# Altium footprint library SMPS1.PcbLib: 25 footprints (part 1 of 2)
Each footprint in its own frame and in the unit in brackets; x right, y up, seen from the top. Pads: shape width x height; smd on the part's side, far side on the other; paste and mask are expansions set on the pad; w line width, h text height; cw(c..) or ccw(c..) is an arc to the next point about the centre after c.
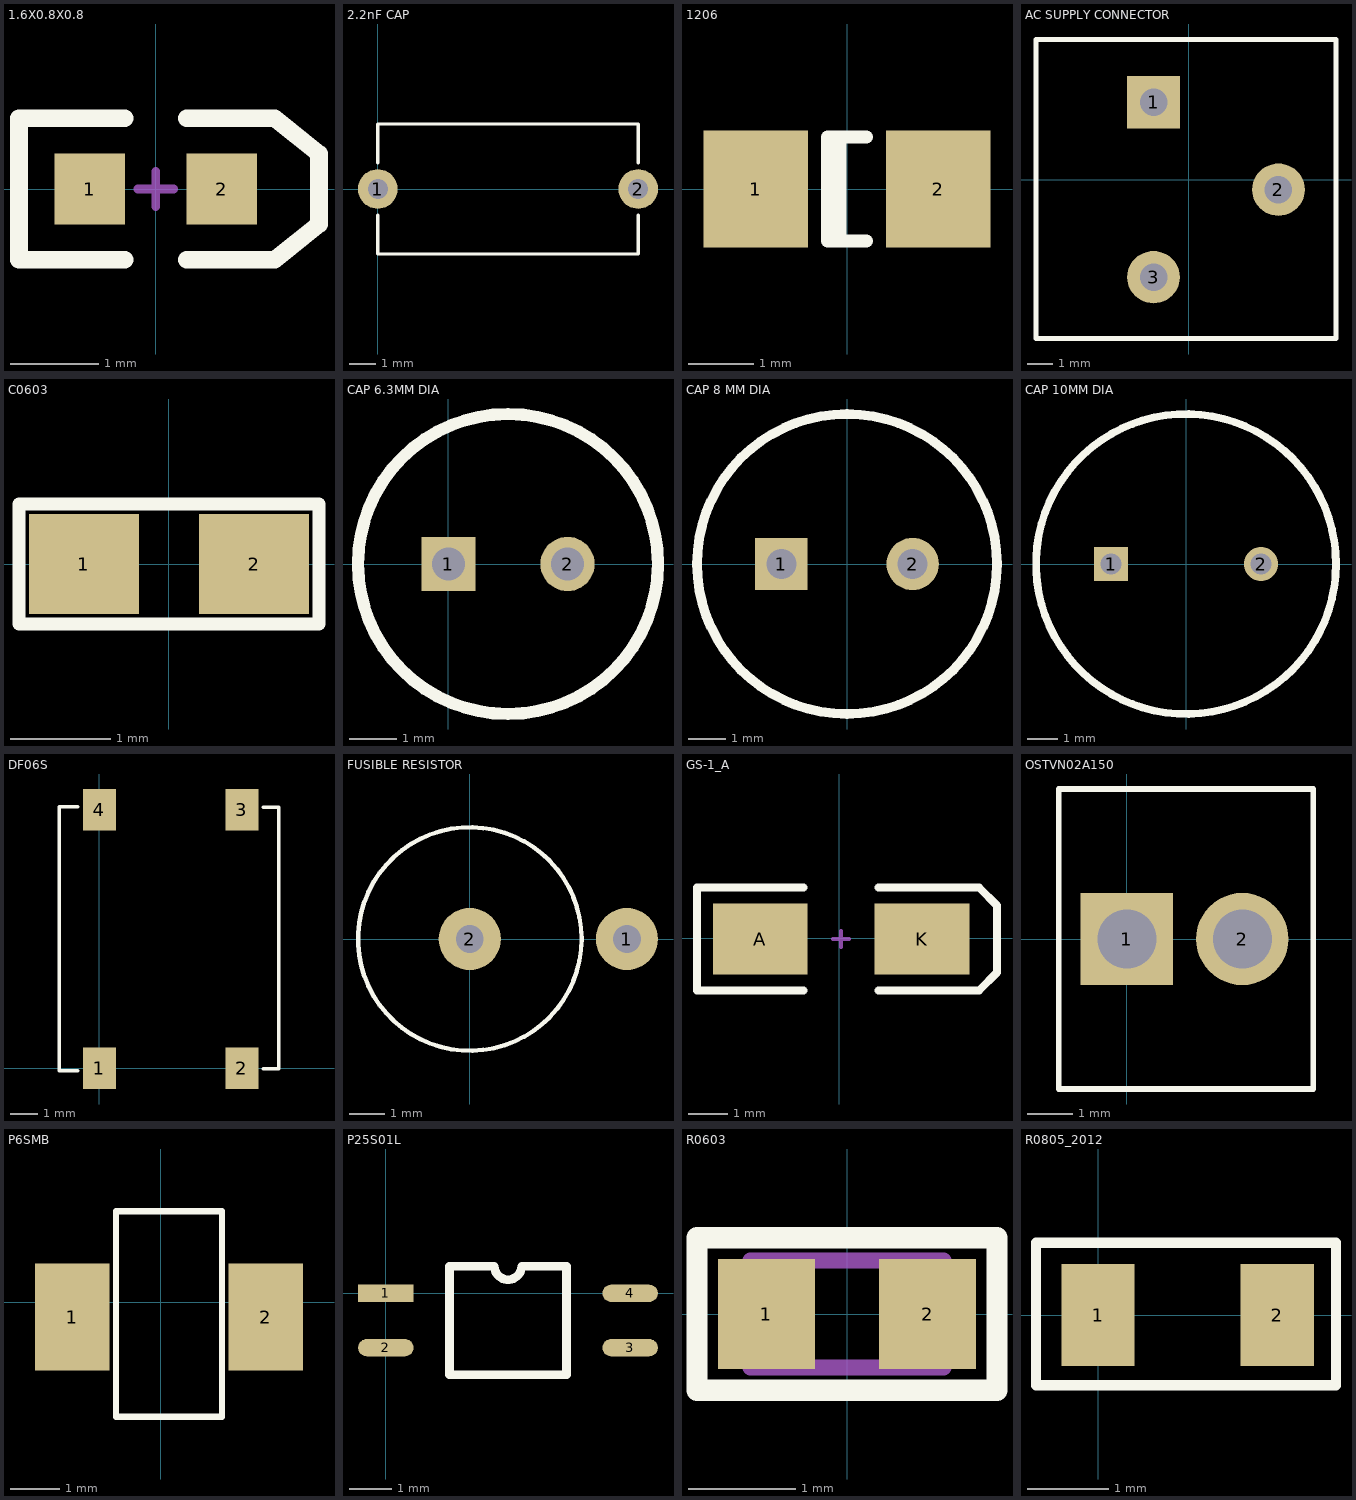
[diagram p0: the footprints below, top view; thin cyan lines are the x and y axes]

## 1.6X0.8X0.8 [mm] "SM LED; 2 Flat Leads"
height 0.9
pads (2):
  rect 0.8x0.8 smd: 1(-0.75,0) 2(0.75,0)
Top Overlay:
  lines w0.2: -0.35,-0.8 -1.55,-0.8 -1.55,0.8 -0.35,0.8 ; 0.35,-0.8 1.35,-0.8 1.85,-0.4 1.85,0.4 1.35,0.8 0.35,0.8
Mechanical 1:
  lines w0.1: -0.2,0 0.2,0 ; 0,-0.2 0,0.2
3D body: height 0.6, standoff 0, extent -0.8,-0.4 0.8,0.4

## 2.2nF CAP [mil]
pads (2):
  round 60 hole 30: 1(0,0) 2(393.7,0)
Top Overlay:
  lines w5: 0,-39.37 0,-98.43 393.7,-98.43 393.7,-39.37 ; 0,39.37 0,98.43 393.7,98.43 393.7,39.37

## 1206 [mm]
pads (2):
  rect 1.6x1.8 smd: 1(-1.4,0) 2(1.4,0)
Top Overlay:
  lines w0.2: -0.11,-0.8 -0.11,0.8 ; 0.3,-0.8 -0.3,-0.8 -0.3,0.8 0.3,0.8
3D body: height 0.53, standoff -0.03, extent -1.6,-0.83 1.6,0.83

## AC SUPPLY CONNECTOR [mm]
pads (3):
  rect 2.1x2.1 hole 1.1 mask+0: 1(-1.4,3.1)
  round 2.1 hole 1.1 mask+0: 2(3.6,-0.4) 3(-1.4,-3.9)
Top Overlay:
  lines w0.203: 5.9,-6.35 -6.1,-6.35 -6.1,-5.6 -6.1,5.6 5.9,5.6 5.9,-5.4 ; 5.9,-6.3 5.9,-5.375
3D body: height 13.1, standoff -3.5, extent -6.2,-5.6 5.8,6.4

## C0603 [mm]
pads (2):
  rect 1.1x1 smd: 1(-0.85,0) 2(0.85,0)
Top Overlay:
  lines w0.127: -1.5,-0.6 1.5,-0.6 1.5,0.6 -1.5,0.6 -1.5,-0.6
3D body: height 0.83, standoff -0.03, extent -0.8,-0.449 0.8,0.411

## CAP 6.3MM DIA [mil]
pads (2):
  rect 45x45 hole 27.56: 1(0,0)
  round 45 hole 27.56: 2(98.43,0)
Top Overlay:
  circle w10: c49.21,0 r124.02
3D body: height 393.7, standoff 0, extent -78.03,-123.76 169.02,123.78

## CAP 8 MM DIA [mm]
pads (2):
  rect 1.397x1.397 hole 0.8: 1(-1.75,0)
  round 1.397 hole 0.8: 2(1.75,0)
Top Overlay:
  circle w0.254: c0,0 r4
3D body: height 17.5, standoff 0, extent -3.969,-3.984 4,4

## CAP 10MM DIA [mm]
pads (2):
  rect 1.143x1.143 hole 0.7: 1(-2.5,0)
  round 1.143 hole 0.7: 2(2.5,0)
Top Overlay:
  circle w0.254: c0,0 r5
3D body: height 17, standoff 0, extent -4.98,-5 4.98,4.98

## DF06S [mm]
pads (4):
  rect 1.2x1.52 smd: 1(0,0) 2(5.2,0) 3(5.2,9.42) 4(0,9.42)
Top Overlay:
  lines w0.127: -0.792,-0.1 -1.47,-0.1 -1.47,9.54 -0.78,9.54 ; 5.969,-0.019 6.55,-0.02 ; 5.97,9.52 6.55,9.52 6.55,-0.019
3D body: height 2.7, standoff 0, extent -1.45,-0.345 6.65,9.805

## FUSIBLE RESISTOR [mil]
pads (2):
  round 70 hole 31.5: 1(177.17,0) 2(0,0)
Top Overlay:
  circle w5: c0,0 r125.98

## GS-1_A [mm]
pads (2):
  rect 2.4x1.8 smd: A(-2.01,-0.014) K(2.09,-0.014)
Top Overlay:
  lines w0.2: -0.91,-1.314 -3.61,-1.314 -3.61,1.286 -0.91,1.286 ; 0.99,-1.314 3.54,-1.314 3.99,-0.864 3.99,0.836 3.54,1.286 0.99,1.286
Mechanical 1:
  lines w0.1: -0.16,-0.014 0.24,-0.014 ; 0.04,-0.214 0.04,0.186
3D body: height 1.2, standoff -0.01, extent -1.723,-0.85 2.027,0.85

## OSTVN02A150 [mil]
pads (2):
  rect 80x80 hole 51.18: 1(0,0)
  round 80 hole 51.18: 2(100,0)
Top Overlay:
  lines w5: -59.06,-129.92 -59.06,129.92 161.42,129.92 161.42,-129.92 -59.06,-129.92

## P6SMB [mm]
pads (2):
  rect 1.52x2.18 smd: 1(-1.8,-0.3) 2(2.137,-0.3)
Top Overlay:
  lines w0.127: -0.911,1.859 1.248,1.859 ; -0.911,1.859 -0.911,-2.332 1.248,-2.332 1.248,1.859 ; -0.911,1.859 1.248,1.859
3D body: height 2.2, standoff -0.05, extent -2.33,-2.13 2.97,1.57

## P25S01L [mm]
pads (4):
  rect 1.3x0.4 smd: 1(0,0)
  oval 1.3x0.4 smd: 2(0,-1.27) 3(5.7,-1.27) 4(5.7,0)
Top Overlay:
  lines w0.2: 1.485,-1.905 1.485,0.635 2.532,0.635 ccw(c2.85,0.635) 3.167,0.635 4.215,0.635 4.215,-1.905 1.485,-1.905
3D body: height 2.01, standoff -0.12, extent -0.7,-1.89 6.3,0.71

## R0603 [mm]
pads (2):
  rect 0.9x1.02 smd: 1(-0.75,0) 2(0.75,0)
Top Overlay:
  lines w0.2: -1.397,-0.711 -1.397,0.711 1.397,0.711 1.397,-0.711 -1.397,-0.711
Mechanical 15:
  lines w0.15: -0.9,-0.5 -0.9,0.5 0.9,0.5 0.9,-0.5 -0.9,-0.5
3D body: height 0.4, standoff 0, extent -0.8,-0.4 0.8,0.4

## R0805_2012 [mm] "0805 inch 2012 metric"
pads (2):
  rect 0.9x1.25 smd: 1(0,0) 2(2.2,0)
Top Overlay:
  lines w0.127: -0.762,-0.864 2.921,-0.864 2.921,0.889 -0.711,0.889 -0.762,0.889 -0.762,-0.864
3D body: height 0.76, standoff 0, extent -0.058,-0.675 2.242,0.675